# Altium schematic symbol library Analog Devices Operational Amplifiers.SchLib: 2102 symbols (part 27 of 35)
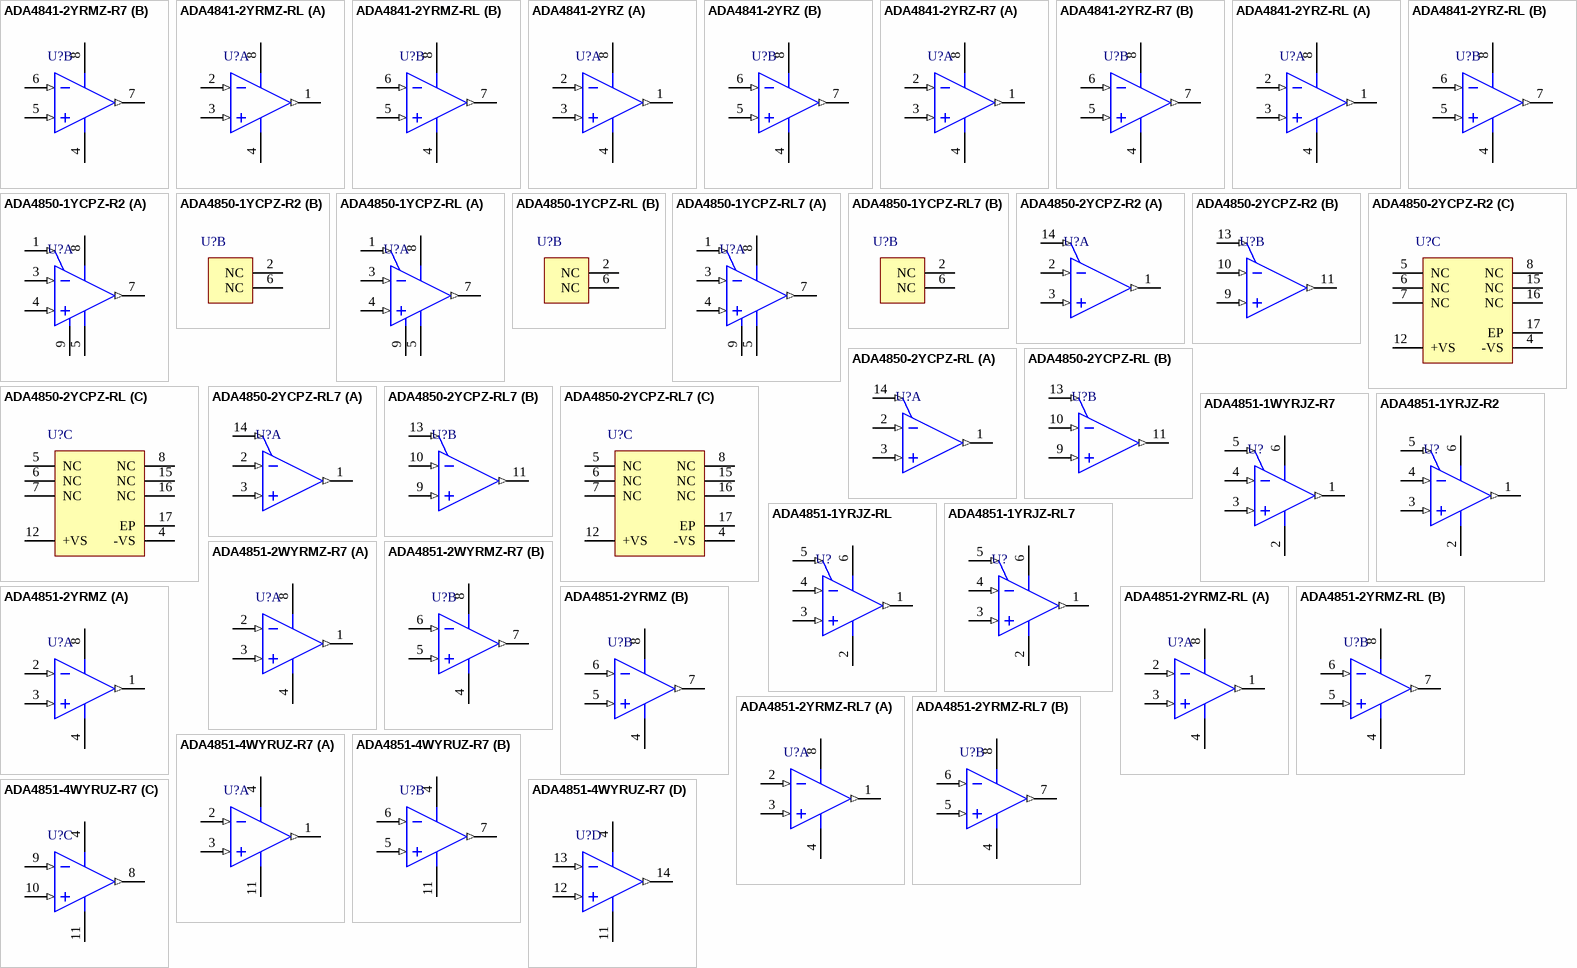
[diagram p140: symbols ADA4841-2YRMZ-R7 to ADA4851-4WYRUZ-R7]

## ADA4850-1YCPZ-R2
designator U?
Single Channel Ultra Low Power-Down Current Operational Amplifier, 175 MHz BW, 220 V/us SR, Industrial, 8-pin QFN (CP-8-2), Reel; Generic Part Number: ADA4850-1; Manufacturer: Analog Devices; PartNumber: ADA4850-1YCPZ-R2; Amplifiers Per Package: 1; Input Bias Current: 2.4uA; Input Offset Voltage: 600uV; Iq/Amp: 2.4mA; Small Signal Bandwidth: 175MHz; V Span Max: 6V; V Span Min: 2.7V; DatasheetVersion: Rev. C; PackageVersion: 061507-B; PackageReference: CP-8-2; PackageDescription: 8-Pin Lead Frame Chip Scale Package, Body 3 x 3 mm, Pitch 0.5 mm; Supplier 1: Digi-Key; Supplier Part Number 1: ADA4850-1YCPZ-R2CT-ND; Supplier 2: Digi-Key; Supplier Part Number 2: ADA4850-1YCPZ-R2DKR-ND; Slew Rate: 220V/us; Mounting Technology: Surface Mount; ComponentLink1Description: Manufacturer URL; ComponentLink1URL: http://www.analog.com/en/index.html; ComponentLink2Description: Datasheet; ComponentLink2URL: http://www.analog.com/static/imported-files/data_sheets/ADA4850-1_4850-2.pdf; ComponentLink3Description: Package Specification; ComponentLink3URL: http://www.analog.com/static/imported-files/packages/56953322593982CP_8_2.pdf
footprint ADI-CP-8-2_N (QFN, 8-Leads, Body 3x3mm, Pitch 0.5mm, Thermal Pad 1.45X1.74mm, IPC Medium Density)
footprint ADI-CP-8-2_L (QFN, 8-Leads, Body 3x3mm, Pitch 0.5mm, Thermal Pad 1.45X1.74mm, IPC High Density)
footprint ADI-CP-8-2_M (QFN, 8-Leads, Body 3x3mm, Pitch 0.5mm, Thermal Pad 1.45X1.74mm, IPC Low Density)
part A pins: 1 POWER DOWN (in), 3 -IN (in), 4 +IN (in), 5 -VS (power), 7 OUT (out), 8 +VS (power), 9 EP (power)
part B pins: 2 NC, 6 NC

## ADA4850-1YCPZ-RL
designator U?
Single Channel Ultra Low Power-Down Current Operational Amplifier, 175 MHz BW, 220 V/us SR, Industrial, 8-pin QFN (CP-8-2), Reel; Generic Part Number: ADA4850-1; Manufacturer: Analog Devices; PartNumber: ADA4850-1YCPZ-RL; Amplifiers Per Package: 1; Input Bias Current: 2.4uA; Input Offset Voltage: 600uV; Iq/Amp: 2.4mA; Small Signal Bandwidth: 175MHz; V Span Max: 6V; V Span Min: 2.7V; DatasheetVersion: Rev. C; PackageVersion: 061507-B; PackageReference: CP-8-2; PackageDescription: 8-Pin Lead Frame Chip Scale Package, Body 3 x 3 mm, Pitch 0.5 mm; Supplier 1: Digi-Key; Supplier Part Number 1: ADA4850-1YCPZ-RL-ND; Slew Rate: 220V/us; Mounting Technology: Surface Mount; ComponentLink1Description: Manufacturer URL; ComponentLink1URL: http://www.analog.com/en/index.html; ComponentLink2Description: Datasheet; ComponentLink2URL: http://www.analog.com/static/imported-files/data_sheets/ADA4850-1_4850-2.pdf; ComponentLink3Description: Package Specification; ComponentLink3URL: http://www.analog.com/static/imported-files/packages/56953322593982CP_8_2.pdf
footprint ADI-CP-8-2_N (QFN, 8-Leads, Body 3x3mm, Pitch 0.5mm, Thermal Pad 1.45X1.74mm, IPC Medium Density)
footprint ADI-CP-8-2_L (QFN, 8-Leads, Body 3x3mm, Pitch 0.5mm, Thermal Pad 1.45X1.74mm, IPC High Density)
footprint ADI-CP-8-2_M (QFN, 8-Leads, Body 3x3mm, Pitch 0.5mm, Thermal Pad 1.45X1.74mm, IPC Low Density)
part A pins: 1 POWER DOWN (in), 3 -IN (in), 4 +IN (in), 5 -VS (power), 7 OUT (out), 8 +VS (power), 9 EP (power)
part B pins: 2 NC, 6 NC

## ADA4850-1YCPZ-RL7
designator U?
Single Channel Ultra Low Power-Down Current Operational Amplifier, 175 MHz BW, 220 V/us SR, Industrial, 8-pin QFN (CP-8-2), Reel; Generic Part Number: ADA4850-1; Manufacturer: Analog Devices; PartNumber: ADA4850-1YCPZ-RL7; Amplifiers Per Package: 1; Input Bias Current: 2.4uA; Input Offset Voltage: 600uV; Iq/Amp: 2.4mA; Small Signal Bandwidth: 175MHz; V Span Max: 6V; V Span Min: 2.7V; DatasheetVersion: Rev. C; PackageVersion: 061507-B; PackageReference: CP-8-2; PackageDescription: 8-Pin Lead Frame Chip Scale Package, Body 3 x 3 mm, Pitch 0.5 mm; Supplier 1: Digi-Key; Supplier Part Number 1: ADA4850-1YCPZ-RL7-ND; Slew Rate: 220V/us; Mounting Technology: Surface Mount; ComponentLink1Description: Manufacturer URL; ComponentLink1URL: http://www.analog.com/en/index.html; ComponentLink2Description: Datasheet; ComponentLink2URL: http://www.analog.com/static/imported-files/data_sheets/ADA4850-1_4850-2.pdf; ComponentLink3Description: Package Specification; ComponentLink3URL: http://www.analog.com/static/imported-files/packages/56953322593982CP_8_2.pdf
footprint ADI-CP-8-2_N (QFN, 8-Leads, Body 3x3mm, Pitch 0.5mm, Thermal Pad 1.45X1.74mm, IPC Medium Density)
footprint ADI-CP-8-2_L (QFN, 8-Leads, Body 3x3mm, Pitch 0.5mm, Thermal Pad 1.45X1.74mm, IPC High Density)
footprint ADI-CP-8-2_M (QFN, 8-Leads, Body 3x3mm, Pitch 0.5mm, Thermal Pad 1.45X1.74mm, IPC Low Density)
part A pins: 1 POWER DOWN (in), 3 -IN (in), 4 +IN (in), 5 -VS (power), 7 OUT (out), 8 +VS (power), 9 EP (power)
part B pins: 2 NC, 6 NC

## ADA4850-2YCPZ-R2
designator U?
Double Channel Ultra Low Power-Down Current Operational Amplifier, 175 MHz BW, 220 V/us SR, Industrial, 16-pin QFN (CP-16-3), Reel; Generic Part Number: ADA4850-2; Manufacturer: Analog Devices; PartNumber: ADA4850-2YCPZ-R2; Amplifiers Per Package: 2; Input Bias Current: 2.4uA; Input Offset Voltage: 600uV; Iq/Amp: 2.4mA; Small Signal Bandwidth: 175MHz; V Span Max: 6V; V Span Min: 2.7V; DatasheetVersion: Rev. C; PackageReference: CP-16-3; PackageDescription: 16-Pin Lead Frame Chip Scale Package, Body 3 x 3 mm, Pitch 0.5 mm; Supplier 1: Digi-Key; Supplier Part Number 1: ADA4850-2YCPZ-R2CT-ND; Supplier 2: Digi-Key; Supplier Part Number 2: ADA4850-2YCPZ-R2DKR-ND; Supplier 3: Farnell; Supplier Part Number 3: 1078232; Supplier 4: Farnell; Supplier Part Number 4: 1078232RL; Slew Rate: 220V/us; Mounting Technology: Surface Mount; Code_JEDEC: MO-220-VEED-2; ComponentLink1Description: Manufacturer URL; ComponentLink1URL: http://www.analog.com/en/index.html; ComponentLink2Description: Datasheet; ComponentLink2URL: http://www.analog.com/static/imported-files/data_sheets/ADA4850-1_4850-2.pdf; ComponentLink3Description: Package Specification; ComponentLink3URL: http://www.analog.com/static/imported-files/packages/PKG_PDF/LFCSP(CP)/CP_16_3.pdf
footprint ADI-CP-16-3_N (QFN, 16-Leads, Body 3x3mm, Pitch 0.5mm, Thermal Pad 1.5x1.5mm, IPC Medium Density)
footprint ADI-CP-16-3_L (QFN, 16-Leads, Body 3x3mm, Pitch 0.5mm, Thermal Pad 1.5x1.5mm, IPC High Density)
footprint ADI-CP-16-3_M (QFN, 16-Leads, Body 3x3mm, Pitch 0.5mm, Thermal Pad 1.5x1.5mm, IPC Low Density)
part A pins: 1 VOUT 1 (out), 2 -IN 1 (in), 3 +IN 1 (in), 14 PD 1 (in)
part B pins: 9 +IN 2 (in), 10 -IN 2 (in), 11 VOUT 2 (out), 13 PD 2 (in)
part C pins: 4 -VS (power), 5 NC, 6 NC, 7 NC, 8 NC, 12 +VS (power), 15 NC, 16 NC, 17 EP (power)

## ADA4850-2YCPZ-RL
designator U?
Double Channel Ultra Low Power-Down Current Operational Amplifier, 175 MHz BW, 220 V/us SR, Industrial, 16-pin QFN (CP-16-3), Reel; Generic Part Number: ADA4850-2; Manufacturer: Analog Devices; PartNumber: ADA4850-2YCPZ-RL; Amplifiers Per Package: 2; Input Bias Current: 2.4uA; Input Offset Voltage: 600uV; Iq/Amp: 2.4mA; Small Signal Bandwidth: 175MHz; V Span Max: 6V; V Span Min: 2.7V; DatasheetVersion: Rev. C; PackageReference: CP-16-3; PackageDescription: 16-Pin Lead Frame Chip Scale Package, Body 3 x 3 mm, Pitch 0.5 mm; Supplier 1: Digi-Key; Supplier Part Number 1: ADA4850-2YCPZ-RL-ND; Slew Rate: 220V/us; Mounting Technology: Surface Mount; Code_JEDEC: MO-220-VEED-2; ComponentLink1Description: Manufacturer URL; ComponentLink1URL: http://www.analog.com/en/index.html; ComponentLink2Description: Datasheet; ComponentLink2URL: http://www.analog.com/static/imported-files/data_sheets/ADA4850-1_4850-2.pdf; ComponentLink3Description: Package Specification; ComponentLink3URL: http://www.analog.com/static/imported-files/packages/PKG_PDF/LFCSP(CP)/CP_16_3.pdf
footprint ADI-CP-16-3_N (QFN, 16-Leads, Body 3x3mm, Pitch 0.5mm, Thermal Pad 1.5x1.5mm, IPC Medium Density)
footprint ADI-CP-16-3_L (QFN, 16-Leads, Body 3x3mm, Pitch 0.5mm, Thermal Pad 1.5x1.5mm, IPC High Density)
footprint ADI-CP-16-3_M (QFN, 16-Leads, Body 3x3mm, Pitch 0.5mm, Thermal Pad 1.5x1.5mm, IPC Low Density)
part A pins: 1 VOUT 1 (out), 2 -IN 1 (in), 3 +IN 1 (in), 14 PD 1 (in)
part B pins: 9 +IN 2 (in), 10 -IN 2 (in), 11 VOUT 2 (out), 13 PD 2 (in)
part C pins: 4 -VS (power), 5 NC, 6 NC, 7 NC, 8 NC, 12 +VS (power), 15 NC, 16 NC, 17 EP (power)

## ADA4850-2YCPZ-RL7
designator U?
Double Channel Ultra Low Power-Down Current Operational Amplifier, 175 MHz BW, 220 V/us SR, Industrial, 16-pin QFN (CP-16-3), Reel; Generic Part Number: ADA4850-2; Manufacturer: Analog Devices; PartNumber: ADA4850-2YCPZ-RL7; Amplifiers Per Package: 2; Input Bias Current: 2.4uA; Input Offset Voltage: 600uV; Iq/Amp: 2.4mA; Small Signal Bandwidth: 175MHz; V Span Max: 6V; V Span Min: 2.7V; DatasheetVersion: Rev. C; PackageReference: CP-16-3; PackageDescription: 16-Pin Lead Frame Chip Scale Package, Body 3 x 3 mm, Pitch 0.5 mm; Supplier 1: Digi-Key; Supplier Part Number 1: ADA4850-2YCPZ-RL7-ND; Slew Rate: 220V/us; Mounting Technology: Surface Mount; Code_JEDEC: MO-220-VEED-2; ComponentLink1Description: Manufacturer URL; ComponentLink1URL: http://www.analog.com/en/index.html; ComponentLink2Description: Datasheet; ComponentLink2URL: http://www.analog.com/static/imported-files/data_sheets/ADA4850-1_4850-2.pdf; ComponentLink3Description: Package Specification; ComponentLink3URL: http://www.analog.com/static/imported-files/packages/PKG_PDF/LFCSP(CP)/CP_16_3.pdf
footprint ADI-CP-16-3_N (QFN, 16-Leads, Body 3x3mm, Pitch 0.5mm, Thermal Pad 1.5x1.5mm, IPC Medium Density)
footprint ADI-CP-16-3_L (QFN, 16-Leads, Body 3x3mm, Pitch 0.5mm, Thermal Pad 1.5x1.5mm, IPC High Density)
footprint ADI-CP-16-3_M (QFN, 16-Leads, Body 3x3mm, Pitch 0.5mm, Thermal Pad 1.5x1.5mm, IPC Low Density)
part A pins: 1 VOUT 1 (out), 2 -IN 1 (in), 3 +IN 1 (in), 14 PD 1 (in)
part B pins: 9 +IN 2 (in), 10 -IN 2 (in), 11 VOUT 2 (out), 13 PD 2 (in)
part C pins: 4 -VS (power), 5 NC, 6 NC, 7 NC, 8 NC, 12 +VS (power), 15 NC, 16 NC, 17 EP (power)

## ADA4851-1WYRJZ-R7
designator U?
Single Channel Low Power Operational Amplifier, 130 MHz BW, 375 V/us SR, Industrial, 6-pin SOT23 (RJ-6), Reel; Generic Part Number: ADA4851-1; Manufacturer: Analog Devices; PartNumber: ADA4851-1WYRJZ-R7; Amplifiers Per Package: 1; Automotive Qualified: Yes; Input Bias Current: 2.2uA; Input Offset Voltage: 600uV; Iq/Amp: 3.2mA; Small Signal Bandwidth: 130MHz; V Span Max: 12V; V Span Min: 2.7V; DatasheetVersion: Rev. J; PackageVersion: 121608-A; PackageReference: RJ-6; PackageDescription: 6-Pin Small Outline Transistor Package, Body 2.9 x 1.6 mm, Pitch 0.95 mm; Supplier 1: Digi-Key; Supplier Part Number 1: ADA4851-1WYRJZ-R7TR-ND; Supplier 2: Digi-Key; Supplier Part Number 2: ADA4851-1WYRJZ-R7CT-ND; Supplier 3: Digi-Key; Supplier Part Number 3: ADA4851-1WYRJZ-R7DKR-ND; Supplier 4: Newark; Supplier Part Number 4: 91R2556; Slew Rate: 375V/us; Mounting Technology: Surface Mount; Code_JEDEC: MO-178-AB; ComponentLink1Description: Manufacturer URL; ComponentLink1URL: http://www.analog.com/en/index.html; ComponentLink2Description: Datasheet; ComponentLink2URL: http://www.analog.com/static/imported-files/data_sheets/ADA4851-1_4851-2_4851-4.pdf; ComponentLink3Description: Package Specification; ComponentLink3URL: http://www.analog.com/static/imported-files/packages/PKG_PDF/SOT-23(RJ)/RJ_6.pdf; ComponentLink4Description: Reference Circuit; ComponentLink4URL: http://www.analog.com/en/all-operational-amplifiers-op-amps/operational-amplifiers-op-amps/ada4851-1/products/product.html#product-recommendations
footprint ADI-RJ-6_N (SOT23, 6-Leads, Body 2.9x1.6mm, Pitch 0.95mm, IPC Medium Density)
footprint ADI-RJ-6_L (SOT23, 6-Leads, Body 2.9x1.6mm, Pitch 0.95mm, IPC High Density)
footprint ADI-RJ-6_M (SOT23, 6-Leads, Body 2.9x1.6mm, Pitch 0.95mm, IPC Low Density)
pins: 1 VOUT (out), 2 -VS (power), 3 +IN (in), 4 -IN (in), 5 ~{POWER DOWN} (in), 6 +VS (power)

## ADA4851-1YRJZ-R2
designator U?
Single Channel Low Power Operational Amplifier, 130 MHz BW, 375 V/us SR, Industrial, 6-pin SOT23 (RJ-6), Reel; Generic Part Number: ADA4851-1; Manufacturer: Analog Devices; PartNumber: ADA4851-1YRJZ-R2; Amplifiers Per Package: 1; Automotive Qualified: Yes; Input Bias Current: 2.2uA; Input Offset Voltage: 600uV; Iq/Amp: 3.2mA; Small Signal Bandwidth: 130MHz; V Span Max: 12V; V Span Min: 2.7V; DatasheetVersion: Rev. J; PackageVersion: 121608-A; PackageReference: RJ-6; PackageDescription: 6-Pin Small Outline Transistor Package, Body 2.9 x 1.6 mm, Pitch 0.95 mm; Supplier 1: Digi-Key; Supplier Part Number 1: ADA4851-1YRJZ-R2CT-ND; Supplier 2: Digi-Key; Supplier Part Number 2: ADA4851-1YRJZ-R2DKR-ND; Supplier 3: Farnell; Supplier Part Number 3: 1078231; Supplier 4: Farnell; Supplier Part Number 4: 1078231RL; Supplier 5: Newark; Supplier Part Number 5: 19M8631; Slew Rate: 375V/us; Mounting Technology: Surface Mount; Code_JEDEC: MO-178-AB; ComponentLink1Description: Manufacturer URL; ComponentLink1URL: http://www.analog.com/en/index.html; ComponentLink2Description: Datasheet; ComponentLink2URL: http://www.analog.com/static/imported-files/data_sheets/ADA4851-1_4851-2_4851-4.pdf; ComponentLink3Description: Package Specification; ComponentLink3URL: http://www.analog.com/static/imported-files/packages/PKG_PDF/SOT-23(RJ)/RJ_6.pdf; ComponentLink4Description: Reference Circuit; ComponentLink4URL: http://www.analog.com/en/all-operational-amplifiers-op-amps/operational-amplifiers-op-amps/ada4851-1/products/product.html#product-recommendations
footprint ADI-RJ-6_N (SOT23, 6-Leads, Body 2.9x1.6mm, Pitch 0.95mm, IPC Medium Density)
footprint ADI-RJ-6_L (SOT23, 6-Leads, Body 2.9x1.6mm, Pitch 0.95mm, IPC High Density)
footprint ADI-RJ-6_M (SOT23, 6-Leads, Body 2.9x1.6mm, Pitch 0.95mm, IPC Low Density)
pins: 1 VOUT (out), 2 -VS (power), 3 +IN (in), 4 -IN (in), 5 ~{POWER DOWN} (in), 6 +VS (power)

## ADA4851-1YRJZ-RL
designator U?
Single Channel Low Power Operational Amplifier, 130 MHz BW, 375 V/us SR, Industrial, 6-pin SOT23 (RJ-6), Reel; Generic Part Number: ADA4851-1; Manufacturer: Analog Devices; PartNumber: ADA4851-1YRJZ-RL; Amplifiers Per Package: 1; Automotive Qualified: Yes; Input Bias Current: 2.2uA; Input Offset Voltage: 600uV; Iq/Amp: 3.2mA; Small Signal Bandwidth: 130MHz; V Span Max: 12V; V Span Min: 2.7V; DatasheetVersion: Rev. J; PackageVersion: 121608-A; PackageReference: RJ-6; PackageDescription: 6-Pin Small Outline Transistor Package, Body 2.9 x 1.6 mm, Pitch 0.95 mm; Supplier 1: Digi-Key; Supplier Part Number 1: ADA4851-1YRJZ-RL-ND; Supplier 2: Newark; Supplier Part Number 2: 59K0903; Slew Rate: 375V/us; Mounting Technology: Surface Mount; Code_JEDEC: MO-178-AB; ComponentLink1Description: Manufacturer URL; ComponentLink1URL: http://www.analog.com/en/index.html; ComponentLink2Description: Datasheet; ComponentLink2URL: http://www.analog.com/static/imported-files/data_sheets/ADA4851-1_4851-2_4851-4.pdf; ComponentLink3Description: Package Specification; ComponentLink3URL: http://www.analog.com/static/imported-files/packages/PKG_PDF/SOT-23(RJ)/RJ_6.pdf; ComponentLink4Description: Reference Circuit; ComponentLink4URL: http://www.analog.com/en/all-operational-amplifiers-op-amps/operational-amplifiers-op-amps/ada4851-1/products/product.html#product-recommendations
footprint ADI-RJ-6_N (SOT23, 6-Leads, Body 2.9x1.6mm, Pitch 0.95mm, IPC Medium Density)
footprint ADI-RJ-6_L (SOT23, 6-Leads, Body 2.9x1.6mm, Pitch 0.95mm, IPC High Density)
footprint ADI-RJ-6_M (SOT23, 6-Leads, Body 2.9x1.6mm, Pitch 0.95mm, IPC Low Density)
pins: 1 VOUT (out), 2 -VS (power), 3 +IN (in), 4 -IN (in), 5 ~{POWER DOWN} (in), 6 +VS (power)

## ADA4851-1YRJZ-RL7
designator U?
Single Channel Low Power Operational Amplifier, 130 MHz BW, 375 V/us SR, Industrial, 6-pin SOT23 (RJ-6), Reel; Generic Part Number: ADA4851-1; Manufacturer: Analog Devices; PartNumber: ADA4851-1YRJZ-RL7; Amplifiers Per Package: 1; Automotive Qualified: Yes; Input Bias Current: 2.2uA; Input Offset Voltage: 600uV; Iq/Amp: 3.2mA; Small Signal Bandwidth: 130MHz; V Span Max: 12V; V Span Min: 2.7V; DatasheetVersion: Rev. J; PackageVersion: 121608-A; PackageReference: RJ-6; PackageDescription: 6-Pin Small Outline Transistor Package, Body 2.9 x 1.6 mm, Pitch 0.95 mm; Supplier 1: Digi-Key; Supplier Part Number 1: ADA4851-1YRJZ-RL7-ND; Supplier 2: Newark; Supplier Part Number 2: 59K0904; Slew Rate: 375V/us; Mounting Technology: Surface Mount; Code_JEDEC: MO-178-AB; ComponentLink1Description: Manufacturer URL; ComponentLink1URL: http://www.analog.com/en/index.html; ComponentLink2Description: Datasheet; ComponentLink2URL: http://www.analog.com/static/imported-files/data_sheets/ADA4851-1_4851-2_4851-4.pdf; ComponentLink3Description: Package Specification; ComponentLink3URL: http://www.analog.com/static/imported-files/packages/PKG_PDF/SOT-23(RJ)/RJ_6.pdf; ComponentLink4Description: Reference Circuit; ComponentLink4URL: http://www.analog.com/en/all-operational-amplifiers-op-amps/operational-amplifiers-op-amps/ada4851-1/products/product.html#product-recommendations
footprint ADI-RJ-6_N (SOT23, 6-Leads, Body 2.9x1.6mm, Pitch 0.95mm, IPC Medium Density)
footprint ADI-RJ-6_L (SOT23, 6-Leads, Body 2.9x1.6mm, Pitch 0.95mm, IPC High Density)
footprint ADI-RJ-6_M (SOT23, 6-Leads, Body 2.9x1.6mm, Pitch 0.95mm, IPC Low Density)
pins: 1 VOUT (out), 2 -VS (power), 3 +IN (in), 4 -IN (in), 5 ~{POWER DOWN} (in), 6 +VS (power)

## ADA4851-2WYRMZ-R7
designator U?
Double Channel Low Power Operational Amplifier, 130 MHz BW, 375 V/us SR, Industrial, 8-pin SOP (RM-8), Reel; Generic Part Number: ADA4851-2; Manufacturer: Analog Devices; PartNumber: ADA4851-2WYRMZ-R7; Amplifiers Per Package: 2; Automotive Qualified: Yes; Input Bias Current: 2.2uA; Input Offset Voltage: 600uV; Iq/Amp: 3.2mA; Small Signal Bandwidth: 130MHz; V Span Max: 12V; V Span Min: 2.7V; DatasheetVersion: Rev. J; PackageReference: RM-8; PackageDescription: 8-Pin Mini Small Outline Package, Body 3 x 3 mm, Pitch 0.65 mm; Supplier 1: Digi-Key; Supplier Part Number 1: ADA4851-2WYRMZ-R7TR-ND; Supplier 2: Digi-Key; Supplier Part Number 2: ADA4851-2WYRMZ-R7CT-ND; Supplier 3: Digi-Key; Supplier Part Number 3: ADA4851-2WYRMZ-R7DKR-ND; Supplier 4: Newark; Supplier Part Number 4: 14R8664; Slew Rate: 375V/us; Mounting Technology: Surface Mount; Code_JEDEC: MO-187-AA; ComponentLink1Description: Manufacturer URL; ComponentLink1URL: http://www.analog.com/en/index.html; ComponentLink2Description: Datasheet; ComponentLink2URL: http://www.analog.com/static/imported-files/data_sheets/ADA4851-1_4851-2_4851-4.pdf; ComponentLink3Description: Package Specification; ComponentLink3URL: http://www.analog.com/static/imported-files/packages/PKG_PDF/MSOP%28RM%29/RM_8.pdf
footprint ADI-RM-8_N (SOP, 8-Leads, Body 3x3mm, Pitch 0.65mm, IPC Medium Density)
footprint ADI-RM-8_L (SOP, 8-Leads, Body 3x3mm, Pitch 0.65mm, IPC High Density)
footprint ADI-RM-8_M (SOP, 8-Leads, Body 3x3mm, Pitch 0.65mm, IPC Low Density)
pins on every part: 4 -VS (power), 8 +VS (power)
part A pins: 1 OUT 1 (out), 2 -IN 1 (in), 3 +IN 1 (in)
part B pins: 5 +IN 2 (in), 6 -IN 2 (in), 7 OUT 2 (out)

## ADA4851-2YRMZ
designator U?
Double Channel Low Power Operational Amplifier, 130 MHz BW, 375 V/us SR, Industrial, 8-pin SOP (RM-8), Tube; Generic Part Number: ADA4851-2; Manufacturer: Analog Devices; PartNumber: ADA4851-2YRMZ; Amplifiers Per Package: 2; Automotive Qualified: Yes; Input Bias Current: 2.2uA; Input Offset Voltage: 600uV; Iq/Amp: 3.2mA; Small Signal Bandwidth: 130MHz; V Span Max: 12V; V Span Min: 2.7V; DatasheetVersion: Rev. J; PackageReference: RM-8; PackageDescription: 8-Pin Mini Small Outline Package, Body 3 x 3 mm, Pitch 0.65 mm; Supplier 1: Digi-Key; Supplier Part Number 1: ADA4851-2YRMZ-ND; Supplier 2: Farnell; Supplier Part Number 2: 1333267; Supplier 3: Newark; Supplier Part Number 3: 15P0325; Supplier 4: Newark; Supplier Part Number 4: 59K0906; Slew Rate: 375V/us; Mounting Technology: Surface Mount; Code_JEDEC: MO-187-AA; ComponentLink1Description: Manufacturer URL; ComponentLink1URL: http://www.analog.com/en/index.html; ComponentLink2Description: Datasheet; ComponentLink2URL: http://www.analog.com/static/imported-files/data_sheets/ADA4851-1_4851-2_4851-4.pdf; ComponentLink3Description: Package Specification; ComponentLink3URL: http://www.analog.com/static/imported-files/packages/PKG_PDF/MSOP%28RM%29/RM_8.pdf
footprint ADI-RM-8_N (SOP, 8-Leads, Body 3x3mm, Pitch 0.65mm, IPC Medium Density)
footprint ADI-RM-8_L (SOP, 8-Leads, Body 3x3mm, Pitch 0.65mm, IPC High Density)
footprint ADI-RM-8_M (SOP, 8-Leads, Body 3x3mm, Pitch 0.65mm, IPC Low Density)
pins on every part: 4 -VS (power), 8 +VS (power)
part A pins: 1 OUT 1 (out), 2 -IN 1 (in), 3 +IN 1 (in)
part B pins: 5 +IN 2 (in), 6 -IN 2 (in), 7 OUT 2 (out)

## ADA4851-2YRMZ-RL
designator U?
Double Channel Low Power Operational Amplifier, 130 MHz BW, 375 V/us SR, Industrial, 8-pin SOP (RM-8), Reel; Generic Part Number: ADA4851-2; Manufacturer: Analog Devices; PartNumber: ADA4851-2YRMZ-RL; Amplifiers Per Package: 2; Automotive Qualified: Yes; Input Bias Current: 2.2uA; Input Offset Voltage: 600uV; Iq/Amp: 3.2mA; Small Signal Bandwidth: 130MHz; V Span Max: 12V; V Span Min: 2.7V; DatasheetVersion: Rev. J; PackageReference: RM-8; PackageDescription: 8-Pin Mini Small Outline Package, Body 3 x 3 mm, Pitch 0.65 mm; Supplier 1: Digi-Key; Supplier Part Number 1: ADA4851-2YRMZ-RL-ND; Slew Rate: 375V/us; Mounting Technology: Surface Mount; Code_JEDEC: MO-187-AA; ComponentLink1Description: Manufacturer URL; ComponentLink1URL: http://www.analog.com/en/index.html; ComponentLink2Description: Datasheet; ComponentLink2URL: http://www.analog.com/static/imported-files/data_sheets/ADA4851-1_4851-2_4851-4.pdf; ComponentLink3Description: Package Specification; ComponentLink3URL: http://www.analog.com/static/imported-files/packages/PKG_PDF/MSOP%28RM%29/RM_8.pdf
footprint ADI-RM-8_N (SOP, 8-Leads, Body 3x3mm, Pitch 0.65mm, IPC Medium Density)
footprint ADI-RM-8_L (SOP, 8-Leads, Body 3x3mm, Pitch 0.65mm, IPC High Density)
footprint ADI-RM-8_M (SOP, 8-Leads, Body 3x3mm, Pitch 0.65mm, IPC Low Density)
pins on every part: 4 -VS (power), 8 +VS (power)
part A pins: 1 OUT 1 (out), 2 -IN 1 (in), 3 +IN 1 (in)
part B pins: 5 +IN 2 (in), 6 -IN 2 (in), 7 OUT 2 (out)

## ADA4851-2YRMZ-RL7
designator U?
Double Channel Low Power Operational Amplifier, 130 MHz BW, 375 V/us SR, Industrial, 8-pin SOP (RM-8), Reel; Generic Part Number: ADA4851-2; Manufacturer: Analog Devices; PartNumber: ADA4851-2YRMZ-RL7; Amplifiers Per Package: 2; Automotive Qualified: Yes; Input Bias Current: 2.2uA; Input Offset Voltage: 600uV; Iq/Amp: 3.2mA; Small Signal Bandwidth: 130MHz; V Span Max: 12V; V Span Min: 2.7V; DatasheetVersion: Rev. J; PackageReference: RM-8; PackageDescription: 8-Pin Mini Small Outline Package, Body 3 x 3 mm, Pitch 0.65 mm; Supplier 1: Digi-Key; Supplier Part Number 1: ADA4851-2YRMZ-RL7-ND; Supplier 2: Newark; Supplier Part Number 2: 59K0908; Slew Rate: 375V/us; Mounting Technology: Surface Mount; Code_JEDEC: MO-187-AA; ComponentLink1Description: Manufacturer URL; ComponentLink1URL: http://www.analog.com/en/index.html; ComponentLink2Description: Datasheet; ComponentLink2URL: http://www.analog.com/static/imported-files/data_sheets/ADA4851-1_4851-2_4851-4.pdf; ComponentLink3Description: Package Specification; ComponentLink3URL: http://www.analog.com/static/imported-files/packages/PKG_PDF/MSOP%28RM%29/RM_8.pdf
footprint ADI-RM-8_N (SOP, 8-Leads, Body 3x3mm, Pitch 0.65mm, IPC Medium Density)
footprint ADI-RM-8_L (SOP, 8-Leads, Body 3x3mm, Pitch 0.65mm, IPC High Density)
footprint ADI-RM-8_M (SOP, 8-Leads, Body 3x3mm, Pitch 0.65mm, IPC Low Density)
pins on every part: 4 -VS (power), 8 +VS (power)
part A pins: 1 OUT 1 (out), 2 -IN 1 (in), 3 +IN 1 (in)
part B pins: 5 +IN 2 (in), 6 -IN 2 (in), 7 OUT 2 (out)
